# Altium footprint library mastermind.PCBLIB: 1061 footprints (part 58 of 67)
Each footprint in its own frame and in the unit in brackets; x right, y up, seen from the top. Pads: shape width x height; smd on the part's side, far side on the other; paste and mask are expansions set on the pad; w line width, h text height; cw(c..) or ccw(c..) is an arc to the next point about the centre after c.
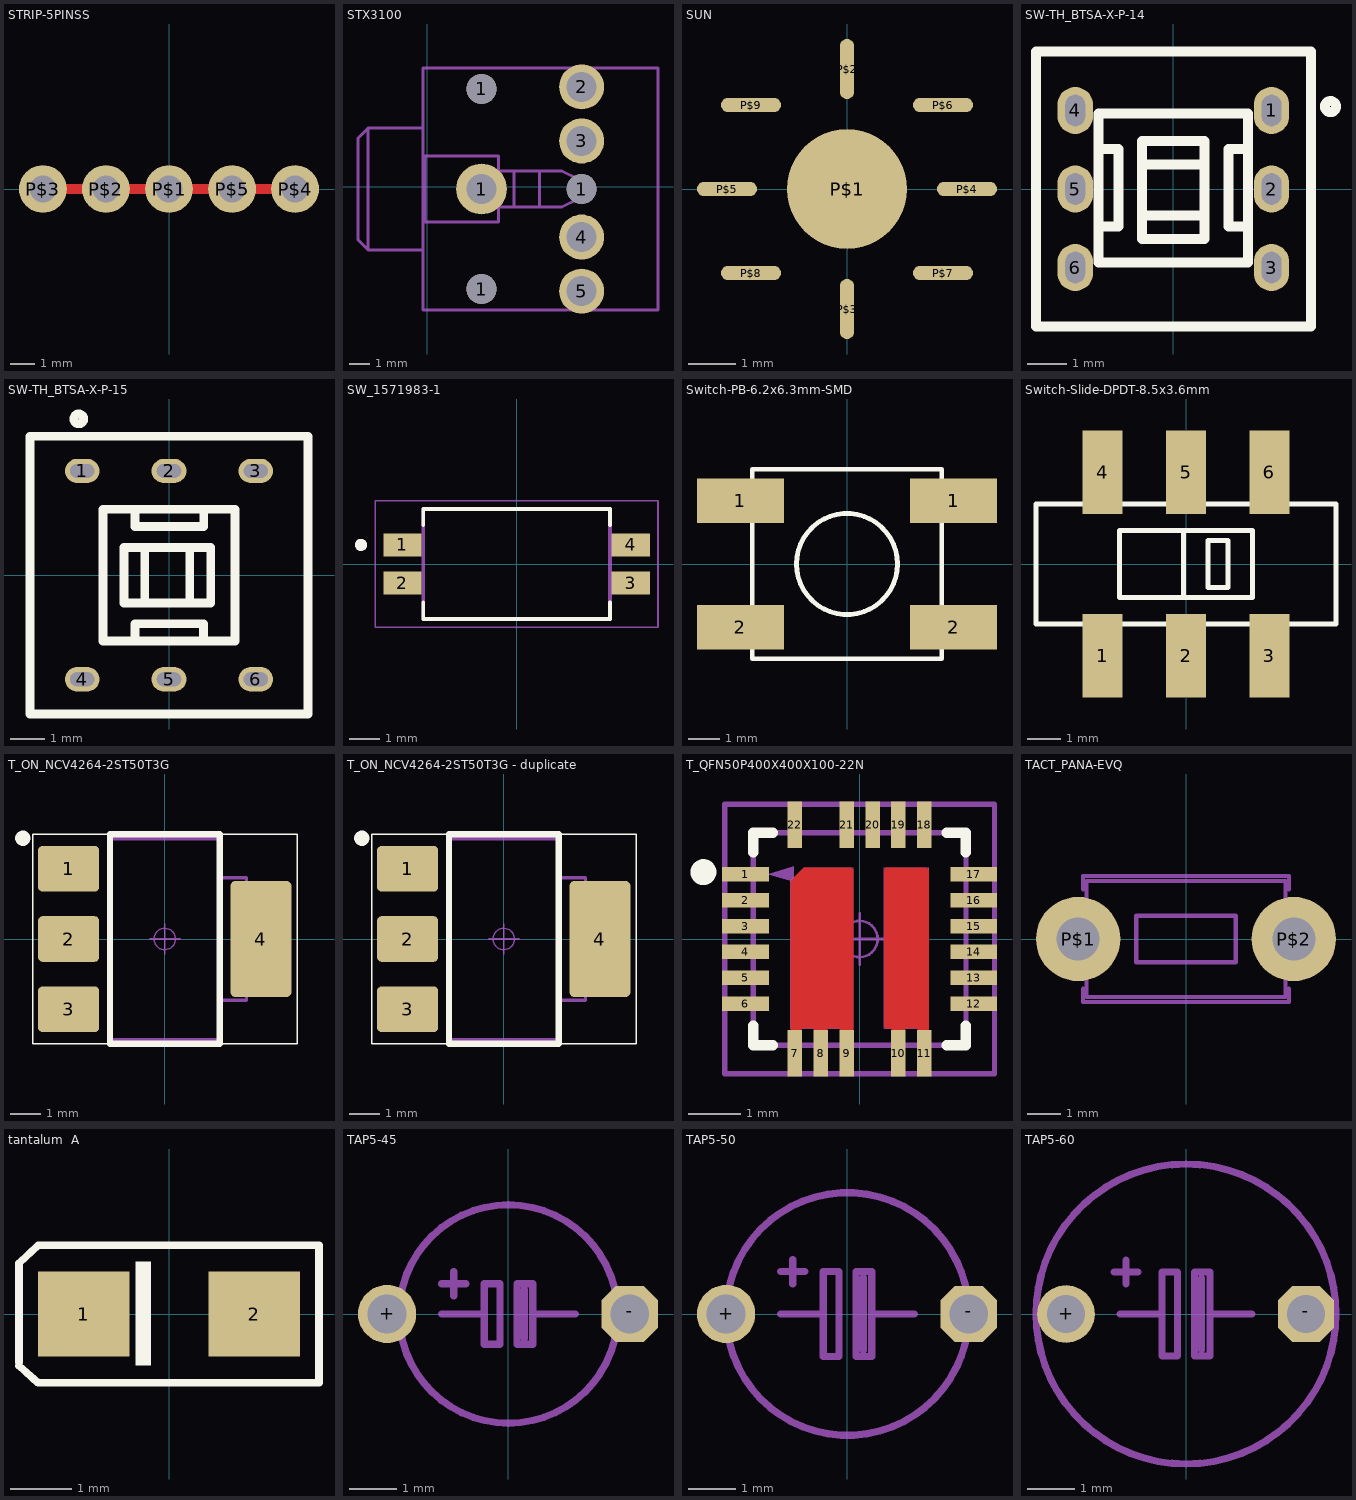
[diagram p57: the footprints below, top view; thin cyan lines are the x and y axes]

## STRIP-5PINSS [mil]
pads (5):
  round 76 hole 43.31: P$1(0,0) P$2(-100,0) P$3(-200,0) P$4(200,0) P$5(100,0)
Top Layer:
  lines w16: -200,0 200,0

## STX3100 [mm]
pads (8):
  round 1.5 hole 1.5: 1(2.7,-5.1) 1(2.7,4.9) 1(7.7,-0.1)
  round 2.54 hole 1.5: 1(2.7,-0.1)
  round 2.25 hole 1.5: 2(7.7,5) 3(7.7,2.3) 4(7.7,-2.5) 5(7.7,-5.2)
Mechanical 2:
  lines w0.152: 4.906,-6.142 -0.212,-6.142 -0.212,-3.148 ; 7.065,-6.142 11.512,-6.142 11.512,5.942 11.51,5.942 ; 9.605,5.942 -0.212,5.942 -0.212,2.948 ; -2.96,-3.148 -0.212,-3.148 ; -2.96,-3.148 -3.468,-2.64 -3.468,2.44 -2.96,2.948 ; -2.96,-3.148 -2.96,2.948 ; -2.96,2.948 -0.212,2.948 ; -0.212,-3.148 -0.212,2.948
Mechanical 8:
  lines w0.152: 4.806,-6.142 6.965,-6.142 ; 9.605,5.942 11.51,5.942 ; 3.552,-0.989 3.552,0.789 ; 3.552,-0.989 3.552,-1.751 -0.131,-1.751 -0.131,1.551 3.552,1.551 3.552,0.789 ; 3.552,-0.989 4.314,-0.989 ; 3.552,0.789 4.314,0.789 ; 4.314,-0.989 5.584,-0.989 ; 4.314,-0.989 4.314,0.789 ; 4.314,0.789 5.584,0.789 ; 5.584,-0.989 5.584,0.789 ; 5.584,-0.989 6.727,-0.989 7.489,-0.608 7.489,0.408 6.727,0.789 5.584,0.789

## SUN [mil]
pads (9):
  rrect100% 100x100 smd: P$1(0,0)
  rrect100% 12x50 smd: P$2(0,100) P$3(0,-100)
  rrect100% 50x12 smd: P$4(100,0) P$5(-100,0) P$6(80,70) P$7(80,-70) P$8(-80,-70) P$9(-80,70)

## SW-TH_BTSA-X-P-14 [mm]
pads (6):
  oval 0.9x1.2 / inner oval 0.7x1 / far side oval 1x1.6 hole 0.5 slot 0.8 at 90 deg: 1(2.5,2) 2(2.5,0) 3(2.5,-2) 4(-2.5,2) 5(-2.5,0) 6(-2.5,-2)
Top Overlay:
  circle w0.254: c4,2.1 r0.141
  lines w0.254: -1.903,-0.956 -1.403,-0.956 -1.403,1.022 -1.903,1.022 ; -0.803,-0.678 0.797,-0.678 ; -0.803,0.622 0.697,0.622 ; 1.897,-0.958 1.397,-0.958 1.397,1.02 1.897,1.02 ; -3.5,-3.5 -3.5,3.5 3.5,3.5 3.5,-3.5 -3.5,-3.5 ; -1.903,-1.878 -1.903,1.922 1.897,1.922 1.897,-1.878 -1.903,-1.878 ; -0.803,-1.278 -0.803,1.222 0.797,1.222 0.797,-1.278 -0.803,-1.278
3D body "Toggle Button (7 x 7 x 12mm) - NON Latching.stp": height 13.54, standoff -3.23, extent -3.355,-3.518 3.554,3.518

## SW-TH_BTSA-X-P-15 [mm]
pads (6):
  oval 1x0.7 hole 0.4 slot 0.7 at 0 deg: 1(-2.5,3) 2(0,3) 3(2.5,3) 4(-2.5,-3) 5(0,-3) 6(2.5,-3)
Top Overlay:
  circle w0.254: c-2.6,4.5 r0.141
  lines w0.254: -0.98,-1.9 -0.98,-1.4 0.998,-1.4 0.998,-1.9 ; -0.978,1.9 -0.978,1.4 1,1.4 1,1.9 ; -0.7,-0.8 -0.7,0.8 ; 0.6,-0.7 0.6,0.8 ; -4,-4 -4,4 4,4 4,-4 -4,-4 ; -1.9,-1.9 -1.9,1.9 1.9,1.9 1.9,-1.9 -1.9,-1.9 ; -1.3,-0.8 -1.3,0.8 1.2,0.8 1.2,-0.8 -1.3,-0.8
3D body "Toggle Button (8.1 x 8.1 x 13.5mm).stp": height 13.54, standoff -3.23, extent -3.937,-4.05 3.937,3.85

## SW_1571983-1 [mm]
pads (4):
  rect 1.27x0.76 smd: 1(-3.795,0.635) 2(-3.795,-0.635) 3(3.795,-0.635) 4(3.795,0.635)
Top Overlay:
  circle w0.2: c-5.17,0.635 r0.1
  lines w0.127: -3.1,-1.27 -3.1,-1.83 3.1,-1.83 3.1,-1.27 ; -3.1,1.3 -3.1,1.83 3.1,1.83 3.1,1.3
Mechanical 13:
  circle w0.2: c-5.17,0.635 r0.1
  lines w0.127: -3.1,-1.83 -3.1,1.83 3.1,1.83 3.1,-1.83 -3.1,-1.83
Mechanical 14:
  lines w0.05: -4.7,-2.1 4.7,-2.1 4.7,2.1 -4.7,2.1 -4.7,-2.1
3D body "User Library-SW_1571983-3.STEP": height 2.32, standoff 0.01, extent -4.065,-1.83 4.065,1.83

## Switch-PB-6.2x6.3mm-SMD [mm]
pads (4):
  rect 2.75x1.4 smd: 1(-3.375,2) 1(3.375,2) 2(-3.375,-2) 2(3.375,-2)
Top Overlay:
  circle w0.152: c0,0 r1.601
  lines w0.152: -3,-3 3,-3 3,3 -3,3 -3,-3
3D body "Switch tact 6x6mm.stp": height 3.1, standoff 0, extent -4,-3 4,3.3

## Switch-Slide-DPDT-8.5x3.6mm [mm]
pads (6):
  rect 1.2x2.5 smd: 1(-2.5,-2.75) 2(0,-2.75) 3(2.5,-2.75) 4(-2.5,2.75) 5(0,2.75) 6(2.5,2.75)
Top Overlay:
  lines w0.152: -0.08,-1 -0.08,1 ; 1.24,0.7 0.66,0.7 0.66,-0.7 1.26,-0.7 1.26,0.7 ; -4.5,-1.8 4.5,-1.8 4.5,1.8 -4.5,1.8 -4.5,-1.8 ; -2,-1 2,-1 2,1 -2,1 -2,-1
3D body: height 3.48, standoff 3, extent -2,1 2,1.8
3D body: height 3.48, standoff 3, extent -2,-1.8 2,-1
3D body: height 3.48, standoff 3, extent 2,-1.8 4.5,1.8
3D body: height 3.5, standoff 3.48, extent 2,-1 4.5,1
3D body: height 3.5, standoff 3.48, extent -4.5,-1.8 4.5,-1
3D body: height 3.5, standoff 3.48, extent -4.5,-1 -2,1
3D body: height 0.9, standoff 0, extent 2.2,-1.825 2.8,-1.675
3D body: height 0.15, standoff 0, extent 2.2,-3.75 2.8,-1.8
3D body: height 0.15, standoff 0, extent -0.3,-3.75 0.3,-1.8
3D body: height 0.9, standoff 0, extent -0.3,-1.825 0.3,-1.675
3D body: height 0.15, standoff 0, extent -2.8,-3.75 -2.2,-1.8
3D body: height 0.9, standoff 0, extent -2.8,-1.825 -2.2,-1.675
3D body: height 0.15, standoff 0, extent -4.2,1.2 -3.9,1.5
3D body: height 0.15, standoff 0, extent 3.9,1.2 4.2,1.5
3D body: height 0.15, standoff 0, extent 3.9,-1.5 4.2,-1.2
3D body: height 0.15, standoff 0, extent -4.2,-1.5 -3.9,-1.2
3D body: height 3, standoff 0.9, extent -4.5,-1.8 4.5,1.8
3D body: height 3.05, standoff 3, extent -2,-1 2,1
3D body: height 5.5, standoff 1.75, extent -0.08,-1 2,1
3D body: height 3.48, standoff 3, extent -4.5,-1.8 -2,1.8
3D body: height 3.5, standoff 2.63, extent 4.5,-1.2 4.52,1.2
3D body: height 2.63, standoff 1.75, extent 4.5,-1.7 4.52,1.7
3D body: height 2.63, standoff 1.75, extent -4.52,-1.7 -4.5,1.7
3D body: height 3.5, standoff 2.63, extent -4.52,-1.2 -4.5,1.2
3D body: height 0.9, standoff 0, extent 2.2,1.675 2.8,1.825
3D body: height 0.15, standoff 0, extent 2.2,1.8 2.8,3.75
3D body: height 0.9, standoff 0, extent -0.3,1.675 0.3,1.825
3D body: height 0.15, standoff 0, extent -0.3,1.8 0.3,3.75
3D body: height 3.5, standoff 3.48, extent -4.5,1 4.5,1.8
3D body: height 0.15, standoff 0, extent -2.8,1.8 -2.2,3.75
3D body: height 0.9, standoff 0, extent -2.8,1.675 -2.2,1.825
3D body: height 0.9, standoff 0.15, extent -4.3,-1.6 4.3,1.675

## T_ON_NCV4264-2ST50T3G [mm]
pads (4):
  rrect20% 2x1.5 smd: 1(-3.15,2.3) 2(-3.15,0) 3(-3.15,-2.3)
  rrect15% 2x3.8 smd: 4(3.15,0)
Top Overlay:
  circle w0.25: c-4.65,3.3 r0.125
  lines w0.05: -4.33,-3.43 4.33,-3.43 4.33,3.43 -4.33,3.43 -4.33,-3.43
  lines w0.2: -1.8,-3.43 1.8,-3.43 1.8,3.43 -1.8,3.43 -1.8,-3.43
Top Component Center:
  circle w0.05: c0,0 r0.35
  lines w0.05: -0.5,0 0.5,0 ; 0,-0.5 0,0.5
Top 3D Body:
  lines w0.001: -1.85,-3.251 -1.85,3.251 1.85,3.251 1.85,-3.251 -1.85,-3.251
Top Dimensions:
  lines w0.1: 1.79,-2.006 2.68,-2.006 2.68,2.006 1.79,2.006 ; -1.85,-3.302 1.79,-3.302 1.79,3.302 -1.85,3.302 -1.85,-3.302
Top Assembly:
  text ".Designator" at -1.807,3.912 h0.75
3D body "User Library-SOT223-3.step": height 1.7, standoff 0, extent -3.5,-3.25 3.5,3.25

## T_ON_NCV4264-2ST50T3G - duplicate [mm]
pads (4):
  rrect20% 2x1.5 smd: 1(-3.15,2.3) 2(-3.15,0) 3(-3.15,-2.3)
  rrect15% 2x3.8 smd: 4(3.15,0)
Top Overlay:
  circle w0.25: c-4.65,3.3 r0.125
  lines w0.05: -4.33,-3.43 -4.33,3.43 4.33,3.43 4.33,-3.43 -4.33,-3.43
  lines w0.2: -1.8,-3.43 -1.8,3.43 1.8,3.43 1.8,-3.43 -1.8,-3.43
Top Component Center:
  circle w0.05: c0,0 r0.35
  lines w0.05: -0.5,0 0.5,0 ; 0,-0.5 0,0.5
Top 3D Body:
  lines w0.001: -1.85,-3.251 1.85,-3.251 1.85,3.251 -1.85,3.251 -1.85,-3.251
Top Dimensions:
  lines w0.1: 1.79,-2.006 2.68,-2.006 2.68,2.006 1.79,2.006 ; -1.85,-3.302 -1.85,3.302 1.79,3.302 1.79,-3.302 -1.85,-3.302
Top Assembly:
  text ".Designator" at -1.807,3.912 h0.75
3D body "User Library-SOT223-3.step": height 1.7, standoff 0, extent -3.5,-3.25 3.5,3.25

## T_QFN50P400X400X100-22N [mm]
pads (22):
  rect 0.9x0.28 smd mask+0.051: 1(-2.2,1.25) 2(-2.2,0.75) 3(-2.2,0.25) 4(-2.2,-0.25) 5(-2.2,-0.75) 6(-2.2,-1.25) 12(2.2,-1.25) 13(2.2,-0.75) 14(2.2,-0.25) 15(2.2,0.25) 16(2.2,0.75) 17(2.2,1.25)
  rect 0.28x0.9 smd mask+0.051: 7(-1.25,-2.2) 8(-0.75,-2.2) 9(-0.25,-2.2) 10(0.75,-2.2) 11(1.25,-2.2) 18(1.25,2.2) 19(0.75,2.2) 20(0.25,2.2) 21(-0.25,2.2) 22(-1.25,2.2)
Top Layer:
  region: 0.525,1.375 0.516,1.375 0.5,1.368 0.487,1.356 0.48,1.339 0.48,1.33 0.48,-1.68 0.48,-1.689 0.487,-1.706 0.499,-1.718 0.516,-1.725 0.525,-1.725 0.6,-1.725 0.605,-1.725 0.614,-1.729 0.621,-1.736 0.625,-1.745 0.625,-1.75 0.625,-1.775 0.875,-1.775 0.875,-1.75 0.875,-1.745 0.879,-1.736 0.886,-1.729 0.895,-1.725 0.9,-1.725 1.1,-1.725 1.105,-1.725 1.114,-1.729 1.121,-1.736 1.125,-1.745 1.125,-1.75 1.125,-1.8 1.255,-1.8 1.27,-1.8 1.297,-1.789 1.319,-1.767 1.33,-1.74 1.33,-1.725 1.33,1.32 1.33,1.331 1.322,1.351 1.306,1.367 1.286,1.375 1.275,1.375
  region: -1.3,1.15 -1.307,1.143 -1.318,1.126 -1.326,1.107 -1.33,1.088 -1.33,1.078 -1.33,-1.875 -1.125,-1.875 -1.125,-1.75 -1.125,-1.745 -1.121,-1.736 -1.114,-1.729 -1.105,-1.725 -1.1,-1.725 -0.9,-1.725 -0.895,-1.725 -0.886,-1.729 -0.879,-1.736 -0.875,-1.745 -0.875,-1.75 -0.875,-1.775 -0.625,-1.775 -0.625,-1.75 -0.625,-1.745 -0.621,-1.736 -0.614,-1.729 -0.605,-1.725 -0.6,-1.725 -0.4,-1.725 -0.395,-1.725 -0.386,-1.729 -0.379,-1.736 -0.375,-1.745 -0.375,-1.75 -0.375,-1.775 -0.125,-1.775 -0.125,1.325 -0.125,1.335 -0.133,1.353 -0.147,1.367 -0.165,1.375 -0.175,1.375 -1.05,1.375 -1.056,1.375 -1.068,1.373 -1.079,1.368 -1.088,1.362 -1.093,1.357
Top Overlay:
  circle w0.25: c-3.01,1.29 r0.125
  lines w0.2: -2.05,-1.676 -2.05,-2.05 -1.676,-2.05 ; -2.05,1.676 -2.05,2.05 -1.676,2.05 ; 1.676,-2.05 2.05,-2.05 2.05,-1.676 ; 1.676,2.05 2.05,2.05 2.05,1.676
Top Paste:
  region: -0.975,1.125 -1.075,1.025 -1.075,-1.475 -0.375,-1.475 -0.375,1.125
  region: 0.7,1.15 1.125,1.15 1.125,-1.5 0.7,-1.5
Mechanical 14:
  lines w0.1: -2.6,-2.6 -2.6,2.6 2.6,2.6 2.6,-2.6 -2.6,-2.6
Top Component Center:
  circle w0.05: c0,0 r0.35
  lines w0.05: -0.5,0 0.5,0 ; 0,-0.5 0,0.5
Top 3D Body:
  lines w0.001: -1.325,1.345 -1.325,1.375 -1.295,1.375 ; -2.05,-2.05 -2.05,2.05 2.05,2.05 2.05,-2.05 -2.05,-2.05 ; -1.325,-1.725 -0.125,-1.725 -0.125,1.375 -1.068,1.375 -1.325,1.118 -1.325,-1.725 ; 0.48,-1.725 0.48,1.375 1.33,1.375 1.33,-1.725 0.48,-1.725
Top Dimensions:
  region: -1.273,1.4 -1.773,1.25 -1.273,1.1
  lines w0.1: -2.05,-2.05 -2.05,2.05 2.05,2.05 2.05,-2.05 -2.05,-2.05
Top Assembly:
  text ".Designator" at -1.75,2.9 h0.75
Top Component Outline:
  region: -2.578,1.1 -2.078,1.25 -2.578,1.4
3D body "test-18.step": height 1, standoff 0, extent -2.051,-2.051 2.051,2.051

## TACT_PANA-EVQ [mm]
pads (2):
  round 2.54 hole 1.3: P$1(-3.25,0) P$2(3.25,0)
Mechanical 2:
  lines w0.127: -3.1,-1.5 -3.1,-1.9 3.1,-1.9 3.1,-1.5 ; -3.1,1.5 -3.1,1.9 3.1,1.9 3.1,1.5
Mechanical 8:
  lines w0.127: -3,-0.5 -3,-1.75 3,-1.75 3,-0.5 ; -3,-0.5 -3,0.5 ; -3,-0.5 -3,0.5 ; -3,-0.5 -3.95,-0.5 -3.95,0 -3.95,0.5 -3,0.5 ; -3,0.5 -3,1.75 3,1.75 3,0.5 ; 3,-0.5 3,0.5 ; 3,-0.5 3,0.5 ; 3,-0.5 3.95,-0.5 3.95,0.5 ; 3,0.5 3.95,0.5 ; 3,0.5 3.95,0.5 ; -1.5,-0.7 1.5,-0.7 1.5,0.7 -1.5,0.7 -1.5,-0.7

## tantalum  A [mm]
pads (2):
  rect 1.5x1.4 smd: 1(-1.4,0) 2(1.4,0)
Top Overlay:
  rectangle: -0.548,-0.85 -0.297,0.864
  lines w0.127: -2.464,-0.85 -2.148,-1.13 0.66,-1.13 2.451,-1.13 ; -2.464,-0.79 -2.464,0.832 -2.148,1.13 0.673,1.13 2.464,1.13 2.464,-1.13
Mechanical 29:
  text ".Comment" at -2.15,-0.36 h1.5
3D body "Tant Cap SMD size A _ 3216-18.stp": height 1.64, standoff 0.01, extent -1.69,-0.79 1.77,0.81

## TAP5-45 [mil]
pads (2):
  round 48 hole 32: +(-100,0)
  oct 46.48x46.48 hole 32: -(100,0)
Mechanical 2:
  lines w6: -75.37,-49.18 ccw(c0,0) 75.37,-49.18 ; -75.37,49.18 cw(c0,0) 75.37,49.18 ; -55,0 -20,0 ; -55,25 -35,25 ; -45,15 -45,35 ; 13,-20 13,20 ; 55,0 20,0 ; -20,0 -20,25 -7,25 -7,-25 -20,-25 -20,0 ; 20,0 20,25 7,25 7,-25 20,-25 20,0
Mechanical 8:
  lines w6: -75.37,-49.18 cw(c0,0) -75.37,49.18 ; 75.37,-49.18 ccw(c0,0) 75.37,49.18

## TAP5-50 [mil]
pads (2):
  round 48 hole 32: +(-100,0)
  oct 46.48x46.48 hole 32: -(100,0)
Mechanical 2:
  lines w6: -84.87,-52.88 ccw(c0,0) 84.87,-52.88 ; -84.87,52.88 cw(c0,0) 84.87,52.88 ; -55,0 -20,0 ; -55,35 -35,35 ; -45,25 -45,45 ; 13,-30 13,30 ; 55,0 20,0 ; -20,0 -20,35 -7,35 -7,-35 -20,-35 -20,0 ; 20,0 20,35 7,35 7,-35 20,-35 20,0
Mechanical 8:
  lines w6: -84.87,-52.88 cw(c0,0) -84.87,52.88 ; 84.87,-52.88 ccw(c0,0) 84.87,52.88

## TAP5-60 [mil]
pads (2):
  round 48 hole 32: +(-100,0)
  oct 46.48x46.48 hole 32: -(100,0)
Mechanical 2:
  lines w6: -113,-53.44 ccw(c0,0) 113,-53.44 ; -113,53.44 cw(c0,0) 113,53.44 ; -60,35 -40,35 ; -55,0 -20,0 ; -50,25 -50,45 ; 13,-30 13,30 ; 55,0 20,0 ; -20,0 -20,-35 -7,-35 -7,35 -20,35 -20,0 ; 20,0 20,-35 7,-35 7,35 20,35 20,0
Mechanical 8:
  lines w6: -113,-53.44 cw(c0,0) -113,53.44 ; 113,-53.44 ccw(c0,0) 113,53.44